# Altium footprint library Revo_connector_kisun.PcbLib: 90 footprints (part 2 of 6)
Each footprint in its own frame and in the unit in brackets; x right, y up, seen from the top. Pads: shape width x height; smd on the part's side, far side on the other; paste and mask are expansions set on the pad; w line width, h text height; cw(c..) or ccw(c..) is an arc to the next point about the centre after c.
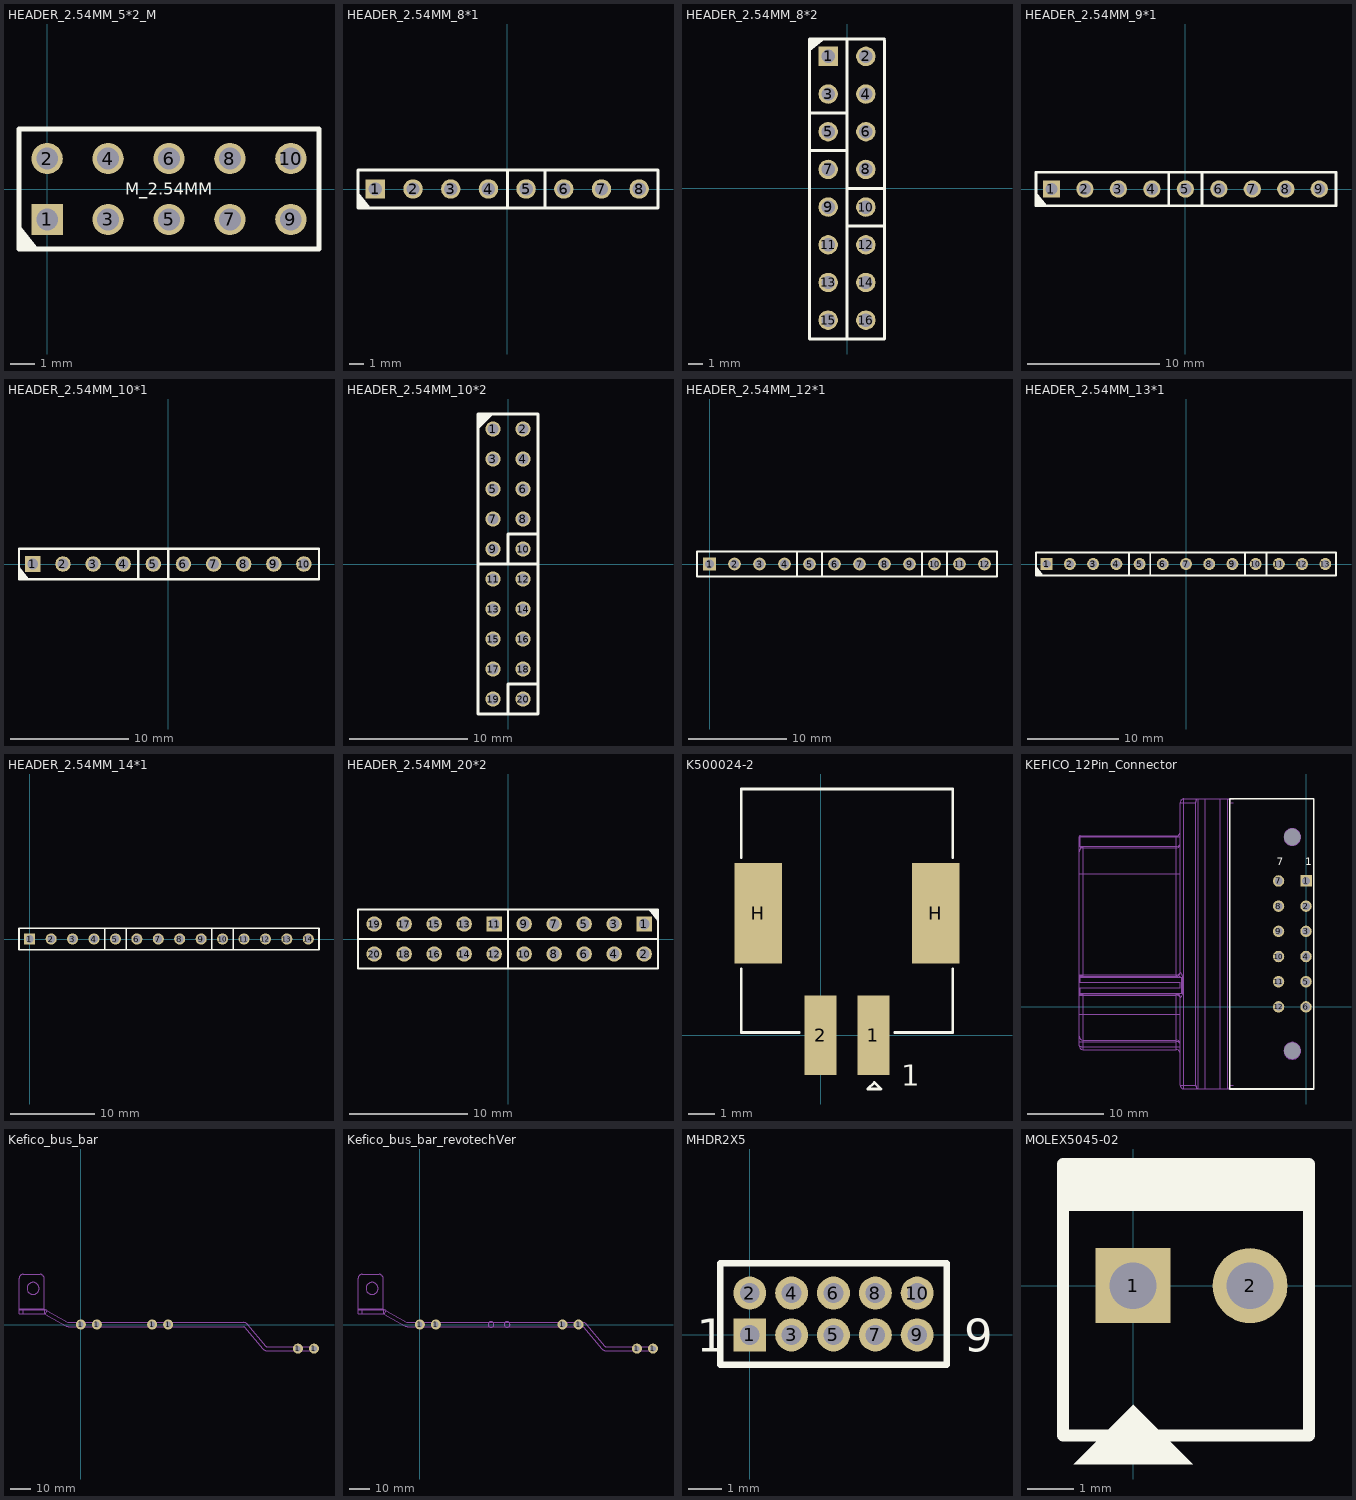
[diagram p1: the footprints below, top view; thin cyan lines are the x and y axes]

## HEADER_2.54MM_5*2_M [mm] "Header Pin 2.54mm pitch 10Pin(5X2)_3D"
pads (10):
  rect 1.31x1.31 hole 0.9 mask+0.1: 1(0,-1.27)
  round 1.31 hole 0.9 mask+0.1: 2(0,1.27) 3(2.54,-1.27) 4(2.54,1.27) 5(5.08,-1.27) 6(5.08,1.27) 7(7.62,-1.27) 8(7.62,1.27) 9(10.16,-1.27) 10(10.16,1.27)
Top Overlay:
  region: -1.15,-1.5 -1.15,-2.5 -0.35,-2.5
  lines w0.203: -1.17,-2.5 -1.17,2.5 ; -1.125,-2.5 11.25,-2.5 ; -1.125,2.5 11.25,2.5 ; 11.33,-2.5 11.33,2.5
  text "M_2.54MM" at 3.25,-0.25 h0.5
3D body "User Library-Header Vertical 2_54mm Pitch2-1.step": height 6.04, standoff -2.84, extent -1.27,-2.54 1.27,0
3D body "User Library-Header Vertical 2_54mm Pitch2-1.step": height 6.04, standoff -2.84, extent 1.27,-2.54 3.81,0
3D body "User Library-Header Vertical 2_54mm Pitch2-1.step": height 6.04, standoff -2.84, extent 3.81,-2.54 6.35,0
3D body "User Library-Header Vertical 2_54mm Pitch2-1.step": height 6.04, standoff -2.84, extent 6.35,-2.54 8.89,0
3D body "User Library-Header Vertical 2_54mm Pitch2-1.step": height 6.04, standoff -2.84, extent 8.89,-2.54 11.43,0
3D body "User Library-Header Vertical 2_54mm Pitch2-1.step": height 6.04, standoff -2.84, extent 8.89,0 11.43,2.54
3D body "User Library-Header Vertical 2_54mm Pitch2-1.step": height 6.04, standoff -2.84, extent 6.35,0 8.89,2.54
3D body "User Library-Header Vertical 2_54mm Pitch2-1.step": height 6.04, standoff -2.84, extent 3.81,0 6.35,2.54
3D body "User Library-Header Vertical 2_54mm Pitch2-1.step": height 6.04, standoff -2.84, extent 1.27,0 3.81,2.54
3D body "User Library-Header Vertical 2_54mm Pitch2-1.step": height 6.04, standoff -2.84, extent -1.27,0 1.27,2.54

## HEADER_2.54MM_8*1 [mm] "Header Pin 2.54mm pitch 8Pin(8X1)"
pads (8):
  rect 1.31x1.31 hole 0.9 mask+0.1: 1(-8.89,0)
  round 1.31 hole 0.9 mask+0.1: 2(-6.35,0) 3(-3.81,0) 4(-1.27,0) 5(1.27,0) 6(3.81,0) 7(6.35,0) 8(8.89,0)
Top Overlay:
  region: -10.04,-0.23 -10.04,-1.23 -9.24,-1.23
  lines w0.203: -10.06,-1.27 -10.06,1.27 10.16,1.27 10.16,-1.27 -10.015,-1.27 ; 0,-1.27 0,1.27 ; 2.54,-1.27 2.54,1.27

## HEADER_2.54MM_8*2 [mm] "Header Pin 2.54mm pitch 16Pin(8X2)"
pads (16):
  rect 1.31x1.31 hole 0.9 mask+0.1: 1(-1.27,8.89)
  round 1.31 hole 0.9 mask+0.1: 2(1.27,8.89) 3(-1.27,6.35) 4(1.27,6.35) 5(-1.27,3.81) 6(1.27,3.81) 7(-1.27,1.27) 8(1.27,1.27) 9(-1.27,-1.27) 10(1.27,-1.27) 11(-1.27,-3.81) 12(1.27,-3.81) 13(-1.27,-6.35) 14(1.27,-6.35) 15(-1.27,-8.89) 16(1.27,-8.89)
Top Overlay:
  region: -1.5,10.04 -2.5,10.04 -2.5,9.24
  lines w0.203: -2.54,2.54 0,2.54 ; -2.54,5.08 0,5.08 ; -2.54,10.015 -2.54,-10.16 0,-10.16 ; -2.54,10.06 0,10.06 ; 0,-2.54 2.54,-2.54 ; 0,0 2.54,0 ; 2.54,9.96 2.54,-10.16 0,-10.16 ; 2.54,10.06 0,10.06 ; 0,-10.16 0,10.06

## HEADER_2.54MM_9*1 [mm] "Header Pin 2.54mm pitch 9Pin(9X1)"
pads (9):
  rect 1.31x1.31 hole 0.9 mask+0.1: 1(-10.16,0)
  round 1.31 hole 0.9 mask+0.1: 2(-7.62,0) 3(-5.08,0) 4(-2.54,0) 5(0,0) 6(2.54,0) 7(5.08,0) 8(7.62,0) 9(10.16,0)
Top Overlay:
  region: -11.31,-0.23 -11.31,-1.23 -10.51,-1.23
  lines w0.203: -11.33,-1.27 -11.33,1.27 11.43,1.27 11.43,-1.27 -11.285,-1.27 ; -1.27,-1.27 -1.27,1.27 ; 1.27,-1.27 1.27,1.27

## HEADER_2.54MM_10*1 [mm] "Header Pin 2.54mm pitch 10Pin(10X1)"
pads (11):
  rect 1.31x1.31 hole 0.9 mask+0.1: 1(-11.43,0)
  round 1.31 hole 0.9 mask+0.1: 2(-8.89,0) 3(-6.35,0) 4(-3.81,0) 5(-1.27,0) 6(1.27,0) 7(3.81,0) 8(6.35,0) 9(8.89,0) 9(8.89,0) 10(11.43,0)
Top Overlay:
  region: -12.58,-0.23 -12.58,-1.23 -11.78,-1.23
  lines w0.203: -12.6,-1.27 -12.6,1.27 12.7,1.27 12.7,-1.27 -12.555,-1.27 ; -2.54,-1.27 -2.54,1.27 ; 0,-1.27 0,1.27
3D body "User Library-RM254_1pin.step": height 6.03, standoff -3.09, extent 10.16,-1.27 12.7,1.27
3D body "User Library-RM254_1pin.step": height 6.03, standoff -3.09, extent 7.62,-1.27 10.16,1.27
3D body "User Library-RM254_1pin.step": height 6.03, standoff -3.09, extent 5.08,-1.27 7.62,1.27
3D body "User Library-RM254_1pin.step": height 6.03, standoff -3.09, extent 2.54,-1.27 5.08,1.27
3D body "User Library-RM254_1pin.step": height 6.03, standoff -3.09, extent 0,-1.27 2.54,1.27
3D body "User Library-RM254_1pin.step": height 6.03, standoff -3.09, extent -2.54,-1.27 0,1.27
3D body "User Library-RM254_1pin.step": height 6.03, standoff -3.09, extent -5.08,-1.27 -2.54,1.27
3D body "User Library-RM254_1pin.step": height 6.03, standoff -3.09, extent -7.62,-1.27 -5.08,1.27
3D body "User Library-RM254_1pin.step": height 6.03, standoff -3.09, extent -10.16,-1.27 -7.62,1.27
3D body "User Library-RM254_1pin.step": height 6.03, standoff -3.09, extent -12.7,-1.27 -10.16,1.27

## HEADER_2.54MM_10*2 [mm] "HEADER_2.54MM_10*2 (20Pin)"
pads (20):
  round 1.31 hole 0.9 mask+0.05: 1(-1.27,11.43) 2(1.27,11.43) 3(-1.27,8.89) 4(1.27,8.89) 5(-1.27,6.35) 6(1.27,6.35) 7(-1.27,3.81) 8(1.27,3.81) 9(-1.27,1.27) 10(1.27,1.27) 11(-1.27,-1.27) 12(1.27,-1.27) 13(-1.27,-3.81) 14(1.27,-3.81) 15(-1.27,-6.35) 16(1.27,-6.35) 17(-1.27,-8.89) 18(1.27,-8.89) 19(-1.27,-11.43) 20(1.27,-11.43)
Top Overlay:
  region: -2.54,12.7 -1.27,12.7 -2.54,11.43
  lines w0.254: -2.54,0 2.54,0 ; 0,-12.7 0,-10.16 2.54,-10.16 ; 0,0 0,2.54 2.54,2.54 ; -2.54,-12.7 -2.54,12.7 2.54,12.7 2.54,-12.7 -2.54,-12.7

## HEADER_2.54MM_12*1 [mm] "Header Pin 2.54mm pitch 13Pin(13X1)"
pads (12):
  rect 1.31x1.31 hole 0.9 mask+0.1: 1(0,0)
  round 1.31 hole 0.9 mask+0.1: 2(2.54,0) 3(5.08,0) 4(7.62,0) 5(10.16,0) 6(12.7,0) 7(15.24,0) 8(17.78,0) 9(20.32,0) 10(22.86,0) 11(25.4,0) 12(27.94,0)
Top Overlay:
  lines w0.203: 8.89,-1.27 8.89,1.27 ; 11.43,-1.27 11.43,1.27 ; 21.59,-1.27 21.59,1.27 ; 24.13,-1.27 24.13,1.27 ; -1.27,-1.27 -1.27,1.27 29.21,1.27 29.21,-1.27 -1.27,-1.27

## HEADER_2.54MM_13*1 [mm] "Header Pin 2.54mm pitch 13Pin(13X1)"
pads (13):
  rect 1.31x1.31 hole 0.9 mask+0.1: 1(-15.24,0)
  round 1.31 hole 0.9 mask+0.1: 2(-12.7,0) 3(-10.16,0) 4(-7.62,0) 5(-5.08,0) 6(-2.54,0) 7(0,0) 8(2.54,0) 9(5.08,0) 10(7.62,0) 11(10.16,0) 12(12.7,0) 13(15.24,0)
Top Overlay:
  region: -16.39,-0.23 -16.39,-1.23 -15.59,-1.23
  lines w0.203: -16.41,-1.27 -16.41,1.27 16.41,1.27 16.41,-1.27 -16.365,-1.27 ; -6.25,-1.27 -6.25,1.27 ; -3.91,-1.27 -3.91,1.27 ; 6.45,-1.27 6.45,1.27 ; 8.79,-1.27 8.79,1.27

## HEADER_2.54MM_14*1 [mm] "Header Pin 2.54mm pitch 13Pin(13X1)"
pads (14):
  rect 1.31x1.31 hole 0.9 mask+0.1: 1(0,0)
  round 1.31 hole 0.9 mask+0.1: 2(2.54,0) 3(5.08,0) 4(7.62,0) 5(10.16,0) 6(12.7,0) 7(15.24,0) 8(17.78,0) 9(20.32,0) 10(22.86,0) 11(25.4,0) 12(27.94,0) 13(30.48,0) 14(33.02,0)
Top Overlay:
  lines w0.203: 8.89,-1.27 8.89,1.27 ; 11.43,-1.27 11.43,1.27 ; 21.59,-1.27 21.59,1.27 ; 24.13,-1.27 24.13,1.27 ; -1.27,-1.27 -1.27,1.27 34.29,1.27 34.29,-1.27 -1.27,-1.27

## HEADER_2.54MM_20*2 [mm] "Header Pin 2.54mm pitch 20Pin(20X2)_3D"
pads (20):
  rect 1.31x1.31 hole 0.9 mask+0.1: 1(11.53,1.27) 11(-1.17,1.27)
  round 1.31 hole 0.9 mask+0.1: 2(11.53,-1.27) 3(8.99,1.27) 4(8.99,-1.27) 5(6.45,1.27) 6(6.45,-1.27) 7(3.91,1.27) 8(3.91,-1.27) 9(1.37,1.27) 10(1.37,-1.27) 12(-1.17,-1.27) 13(-3.71,1.27) 14(-3.71,-1.27) 15(-6.25,1.27) 16(-6.25,-1.27) 17(-8.79,1.27) 18(-8.79,-1.27) 19(-11.33,1.27) 20(-11.33,-1.27)
Top Overlay:
  region: 12.68,1.5 12.68,2.5 11.88,2.5
  lines w0.203: -12.7,0 12.7,0 ; 0,-2.5 0,2.5 ; 12.655,2.5 -12.7,2.5 -12.7,-2.5 12.7,-2.5 12.7,2.5

## K500024-2 [mm]
pads (4):
  rect 1.2x3 smd: 1(2,0) 2(0,0)
  rect 1.8x3.8 smd: H(-2.35,4.6) H(4.35,4.6)
Top Overlay:
  lines w0.1: -3,2.5 -3,0.1 -0.8,0.1 ; -3,6.7 -3,9.3 5,9.3 5,6.7 ; 2.8,0.1 5,0.1 5,2.5 ; 1.778,-2.032 2.032,-1.778 2.286,-2.032 1.778,-2.032
  text "1" at 3.048,-1.905 h0.8
3D body "K500024-2_step.stp": height 5.7, standoff 0, extent -3,-0.7 5,9.3

## KEFICO_12Pin_Connector [mm]
pads (14):
  rect 1.5x1.5 hole 1 paste-2539.97: 1(0,16.5)
  round 1.5 hole 1: 2(0,13.2) 3(0,9.9) 4(0,6.6) 5(0,3.3) 6(0,0) 7(-3.6,16.5) 8(-3.6,13.2) 9(-3.6,9.9) 10(-3.6,6.6) 11(-3.6,3.3) 12(-3.6,0)
  round 0 hole 2.2: H(-1.8,-5.75) H(-1.8,22.25)
Top Overlay:
  lines w0.2: -10,-10.75 -10,27.25 1,27.25 1,-10.75 -10,-10.75
  text "1" at -0.127,18.542 h1
  text "7" at -3.81,18.542 h1
Mechanical 1:
  drawing of 861 lines, arcs and shapes, not listed
3D body "connector2.stp": height 16.4, standoff -3.95, extent -29.993,-10.79 0.508,27.25

## Kefico_bus_bar [mm]
pads (6):
  round 5 hole 2.8: 1(0,0) 1(8,0) 1(35.5,0) 1(43.5,0) 1(108.048,-11.999) 1(116.048,-11.999)
Mechanical 1:
  circle w0.013: c-23.752,17.951 r3
  lines w0.013: -30.752,7.751 -18.252,7.751 ; -28.752,5.251 -28.752,7.251 ; -18.252,7.251 -18.252,22.951 ccw(c-20.252,22.951) -20.252,24.951 -28.752,24.951 ccw(c-28.752,22.951) -30.752,22.951 -30.752,7.251 ; -30.752,7.251 -17.886,7.251 ; -30.752,7.251 -30.752,5.251 -17.886,5.251 ; -17.886,5.251 cw(c-17.886,4.751) -17.636,5.184 ; -17.886,5.251 -17.886,7.251 ; -17.886,7.251 cw(c-17.886,4.751) -16.636,6.916 ; -17.886,7.251 cw(c-17.886,4.751) -16.636,6.916 ; -17.636,5.184 -16.636,6.916 ; -17.636,5.184 -7.507,-0.665 ccw(c-6.257,1.501) -6.257,-0.999 81.015,-0.999 cw(c81.015,-1.499) 81.398,-1.178 90.568,-12.106 ccw(c92.483,-10.499) 92.483,-12.999 116.848,-12.999 116.848,-10.999 92.483,-10.999 cw(c92.483,-10.499) 92.1,-10.821 82.93,0.108 ccw(c81.015,-1.499) 81.015,1.001 -6.257,1.001 cw(c-6.257,1.501) -6.507,1.068 -16.636,6.916
Mechanical 15:
  circle w0.013: c43.5,0 r1.4
  circle w0.013: c35.5,0 r1.4
  circle w0.013: c116.05,-12 r1.4
  circle w0.013: c108.05,-12 r1.4
  circle w0.013: c8,0 r1.4
  circle w0.013: c0,0 r1.4
3D body: height 0, standoff -1.6, extent -30.752,5.251 -18.252,24.951
3D body: height 5, standoff 0, extent -30.752,-12.999 116.848,7.251

## Kefico_bus_bar_revotechVer [mm]
pads (6):
  round 5 hole 2.8: 1(0,0) 1(8,0) 1(71,0) 1(79,0) 1(108.048,-11.999) 1(116.048,-11.999)
Mechanical 1:
  circle w0.013: c-23.752,17.951 r3
  lines w0.013: -30.752,7.751 -18.252,7.751 ; -28.752,5.251 -28.752,7.251 ; -18.252,7.251 -18.252,22.951 ccw(c-20.252,22.951) -20.252,24.951 -28.752,24.951 ccw(c-28.752,22.951) -30.752,22.951 -30.752,7.251 ; -30.752,7.251 -30.752,5.251 -17.886,5.251 ; -30.752,7.251 -17.886,7.251 ; -17.886,5.251 cw(c-17.886,4.751) -17.636,5.184 ; -17.886,5.251 -17.886,7.251 ; -17.886,7.251 cw(c-17.886,4.751) -16.636,6.916 ; -17.886,7.251 cw(c-17.886,4.751) -16.636,6.916 ; -17.636,5.184 -7.507,-0.665 ccw(c-6.257,1.501) -6.257,-0.999 81.015,-0.999 cw(c81.015,-1.499) 81.398,-1.178 90.568,-12.106 ccw(c92.483,-10.499) 92.483,-12.999 116.848,-12.999 116.848,-10.999 92.483,-10.999 cw(c92.483,-10.499) 92.1,-10.821 82.93,0.108 ccw(c81.015,-1.499) 81.015,1.001 -6.257,1.001 cw(c-6.257,1.501) -6.507,1.068 -16.636,6.916 ; -17.636,5.184 -16.636,6.916
Mechanical 15:
  circle w0.013: c0,0 r1.4
  circle w0.013: c8,0 r1.4
  circle w0.013: c108.05,-12 r1.4
  circle w0.013: c116.05,-12 r1.4
  circle w0.013: c35.5,0 r1.4
  circle w0.013: c43.5,0 r1.4
3D body: height 5, standoff 0, extent -30.752,-12.999 116.848,7.251
3D body: height 0, standoff -1.6, extent -30.752,5.251 -18.252,24.951

## MHDR2X5 [mm]
pads (10):
  rect 1x1 hole 0.6: 1(0,0)
  round 1 hole 0.6: 2(0,1.27) 3(1.27,0) 4(1.27,1.27) 5(2.54,0) 6(2.54,1.27) 7(3.81,0) 8(3.81,1.27) 9(5.08,0) 10(5.08,1.27)
Top Overlay:
  lines w0.2: -0.9,-0.9 -0.9,2.17 5.98,2.17 5.98,-0.9 -0.9,-0.9
  text "9" at 6.5,-0.508 h1
  text "1" at -1.6,-0.508 h1

## MOLEX5045-02 [mm]
pads (2):
  rect 1.6x1.6 hole 1: 1(0,0)
  round 1.6 hole 1: 2(2.5,0)
Top Overlay:
  region: 0,-2.54 -1.27,-3.81 1.27,-3.81
  region: -1.4,1.6 3.72,1.6 3.72,2.6 -1.4,2.6
  lines w0.254: -1.5,-3.2 -1.5,2.6 3.72,2.6 ; -1.48,-3.2 3.72,-3.2 ; 3.76,-3.2 3.76,2.6